# Altium footprint library SAMTEC THD.PcbLib: 161 footprints (part 2 of 12) (continued)
## SAMTEC_IPS1-105-01-L-D [mm] "10 Contacts - Pitch 2.54mm - Shrouded Power Connector Set"
height 8.51
pads (10):
  round 1.7 hole 1: 1(5.08,-1.27) 2(5.08,1.27) 3(2.54,-1.27) 4(2.54,1.27) 5(0,-1.27) 6(0,1.27) 7(-2.54,-1.27) 8(-2.54,1.27) 9(-5.08,-1.27) 10(-5.08,1.27)
Top Overlay:
  circle w0.3: c7.239,-1.27 r0.15
  lines w0.2: -6.54,-2.48 6.54,-2.48 6.54,2.48 -6.54,2.48 -6.54,-2.48
  text "2" at 6.912,0.911 h1
Mechanical 8:
  lines w0.1: -5.58,-1.27 -5.08,-1.27 ; -5.58,1.27 -5.08,1.27 ; -5.08,-1.77 -5.08,-1.27 ; -5.08,-0.77 -5.08,-1.27 ; -5.08,0.77 -5.08,1.27 ; -5.08,1.77 -5.08,1.27 ; -4.58,-1.27 -5.08,-1.27 ; -4.58,1.27 -5.08,1.27 ; -3.04,-1.27 -2.54,-1.27 ; -3.04,1.27 -2.54,1.27 ; -2.54,-1.77 -2.54,-1.27 ; -2.54,-0.77 -2.54,-1.27 ; -2.54,0.77 -2.54,1.27 ; -2.54,1.77 -2.54,1.27 ; -2.04,-1.27 -2.54,-1.27 ; -2.04,1.27 -2.54,1.27 ; -0.5,-1.27 0,-1.27 ; -0.5,0 0,0 ; -0.5,1.27 0,1.27 ; 0,-1.77 0,-1.27 ; 0,-0.77 0,-1.27 ; 0,-0.5 0,0 ; 0,0.5 0,0 ; 0,0.77 0,1.27 ; 0,1.77 0,1.27 ; 0.5,-1.27 0,-1.27 ; 0.5,0 0,0 ; 0.5,1.27 0,1.27 ; 2.04,-1.27 2.54,-1.27 ; 2.04,1.27 2.54,1.27 ; 2.54,-1.77 2.54,-1.27 ; 2.54,-0.77 2.54,-1.27 ; 2.54,0.77 2.54,1.27 ; 2.54,1.77 2.54,1.27 ; 3.04,-1.27 2.54,-1.27 ; 3.04,1.27 2.54,1.27 ; 4.58,-1.27 5.08,-1.27 ; 4.58,1.27 5.08,1.27 ; 5.08,-1.77 5.08,-1.27 ; 5.08,-0.77 5.08,-1.27 ; 5.08,0.77 5.08,1.27 ; 5.08,1.77 5.08,1.27 ; 5.58,-1.27 5.08,-1.27 ; 5.58,1.27 5.08,1.27
Mechanical 14:
  circle w0.3: c7.239,-1.27 r0.15
  lines w0.1: -6.1,-1.71 -6.1,-0.44 ; -6.091,-1.71 ccw(c-5.71,-1.71) -5.71,-2.091 ; -6.04,-1.71 -6.04,-0.5 ; -6.031,-1.71 ccw(c-5.71,-1.71) -5.71,-2.031 ; -5.71,-2.1 -4.44,-2.1 ; -5.71,-2.04 -4.44,-2.04 ; -4.44,-2.091 ccw(c-4.44,-1.71) -4.059,-1.71 ; -4.44,-2.031 ccw(c-4.44,-1.71) -4.119,-1.71 ; -4.12,-1.71 -4.12,-0.5 ; -4.06,-1.71 -4.06,-0.44 ; -3.561,-1.71 ccw(c-3.18,-1.71) -3.18,-2.091 ; -3.56,-1.71 -3.56,-0.44 ; -3.501,-1.71 ccw(c-3.18,-1.71) -3.18,-2.031 ; -3.5,-1.71 -3.5,-0.5 ; -3.18,-2.1 -1.91,-2.1 ; -3.18,-2.04 -1.91,-2.04 ; -1.9,-2.091 ccw(c-1.9,-1.71) -1.519,-1.71 ; -1.9,-2.031 ccw(c-1.9,-1.71) -1.579,-1.71 ; -1.58,-1.71 -1.58,-0.5 ; -1.52,-1.71 -1.52,-0.44 ; -1.02,-1.71 -1.02,-0.44 ; -1.011,-1.71 ccw(c-0.63,-1.71) -0.63,-2.091 ; -0.96,-1.71 -0.96,-0.5 ; -0.951,-1.71 ccw(c-0.63,-1.71) -0.63,-2.031 ; -0.63,-2.1 0.64,-2.1 ; -0.63,-2.04 0.64,-2.04 ; 0.63,-2.091 ccw(c0.63,-1.71) 1.011,-1.71 ; 0.63,-2.031 ccw(c0.63,-1.71) 0.951,-1.71 ; 0.96,-1.71 0.96,-0.5 ; 1.02,-1.71 1.02,-0.44 ; 1.519,-1.71 ccw(c1.9,-1.71) 1.9,-2.091 ; 1.52,-1.71 1.52,-0.44 ; 1.579,-1.71 ccw(c1.9,-1.71) 1.9,-2.031 ; 1.58,-1.71 1.58,-0.5 ; 1.9,-2.1 3.17,-2.1 ; 1.9,-2.04 3.17,-2.04 ; 3.18,-2.091 ccw(c3.18,-1.71) 3.561,-1.71 ; 3.18,-2.031 ccw(c3.18,-1.71) 3.501,-1.71 ; 3.5,-1.71 3.5,-0.5 ; 3.56,-1.71 3.56,-0.44 ; 4.059,-1.71 ccw(c4.44,-1.71) 4.44,-2.091 ; 4.06,-1.71 4.06,-0.44 ; 4.119,-1.71 ccw(c4.44,-1.71) 4.44,-2.031 ; 4.12,-1.71 4.12,-0.5 ; 4.44,-2.1 5.71,-2.1 ; 4.44,-2.04 5.71,-2.04 ; 5.71,-2.091 ccw(c5.71,-1.71) 6.091,-1.71 ; 5.71,-2.031 ccw(c5.71,-1.71) 6.031,-1.71 ; 6.04,-1.71 6.04,-0.5 ; 6.1,-1.71 6.1,-0.44 ; -6.1,-0.44 -4.06,-0.44 ; -6.1,-0.44 -6.04,-0.5 ; -6.1,0.44 -4.06,0.44 ; -6.1,0.44 -6.1,2.1 ; -6.1,0.44 -6.04,0.5 ; -6.1,2.1 -4.06,2.1 ; -6.1,2.1 -6.04,2.04 ; -6.04,-0.5 -4.12,-0.5 ; -6.04,0.5 -6.04,2.04 ; -6.04,0.5 -4.12,0.5 ; -6.04,2.04 -4.12,2.04 ; -4.12,-0.5 -4.06,-0.44 ; -4.12,0.5 -4.12,2.04 ; -4.12,0.5 -4.06,0.44 ; -4.12,2.04 -4.06,2.1 ; -4.06,0.44 -4.06,2.1 ; -3.56,-0.44 -1.52,-0.44 ; -3.56,-0.44 -3.5,-0.5 ; -3.56,0.44 -1.52,0.44 ; -3.56,0.44 -3.56,2.1 ; -3.56,0.44 -3.5,0.5 ; -3.56,2.1 -1.52,2.1 ; -3.56,2.1 -3.5,2.04 ; -3.5,-0.5 -1.58,-0.5 ; -3.5,0.5 -3.5,2.04 ; -3.5,0.5 -1.58,0.5 ; -3.5,2.04 -1.58,2.04 ; -1.58,-0.5 -1.52,-0.44 ; -1.58,0.5 -1.58,2.04 ; -1.58,0.5 -1.52,0.44 ; -1.58,2.04 -1.52,2.1 ; -1.52,0.44 -1.52,2.1 ; -1.02,-0.44 1.02,-0.44 ; -1.02,-0.44 -0.96,-0.5 ; -1.02,0.44 1.02,0.44 ; -1.02,0.44 -1.02,2.1 ; -1.02,0.44 -0.96,0.5 ; -1.02,2.1 1.02,2.1 ; -1.02,2.1 -0.96,2.04 ; -0.96,-0.5 0.96,-0.5 ; -0.96,0.5 -0.96,2.04 ; -0.96,0.5 0.96,0.5 ; -0.96,2.04 0.96,2.04 ; 0.96,-0.5 1.02,-0.44 ; 0.96,0.5 0.96,2.04 ; 0.96,0.5 1.02,0.44 ; 0.96,2.04 1.02,2.1 ; 1.02,0.44 1.02,2.1 ; 1.52,-0.44 3.56,-0.44 ; 1.52,-0.44 1.58,-0.5 ; 1.52,0.44 3.56,0.44 ; 1.52,0.44 1.52,2.1 ; 1.52,0.44 1.58,0.5 ; 1.52,2.1 3.56,2.1 ; 1.52,2.1 1.58,2.04 ; 1.58,-0.5 3.5,-0.5 ; 1.58,0.5 1.58,2.04 ; 1.58,0.5 3.5,0.5 ; 1.58,2.04 3.5,2.04 ; 3.5,-0.5 3.56,-0.44 ; 3.5,0.5 3.5,2.04 ; 3.5,0.5 3.56,0.44 ; 3.5,2.04 3.56,2.1 ; 3.56,0.44 3.56,2.1 ; 4.06,-0.44 6.1,-0.44 ; 4.06,-0.44 4.12,-0.5 ; 4.06,0.44 6.1,0.44 ; 4.06,0.44 4.06,2.1 ; 4.06,0.44 4.12,0.5 ; 4.06,2.1 6.1,2.1 ; 4.06,2.1 4.12,2.04 ; 4.12,-0.5 6.04,-0.5 ; 4.12,0.5 4.12,2.04 ; 4.12,0.5 6.04,0.5 ; 4.12,2.04 6.04,2.04 ; 6.04,-0.5 6.1,-0.44 ; 6.04,0.5 6.04,2.04 ; 6.04,0.5 6.1,0.44 ; 6.04,2.04 6.1,2.1 ; 6.1,0.44 6.1,2.1 ; -6.54,-2.48 -6.54,2.48 6.54,2.48 6.54,-2.48 -6.54,-2.48
  text "2" at 6.912,0.911 h1
3D body "SAMTEC_IPS1-105-01-L-D.stp": height 8.51, standoff -2.54, extent -6.54,-2.476 6.541,2.477

## SAMTEC_IPS1-120-01-L-D-RA [mm] "40 Contacts - Pitch 2.54mm - Shrouded Power Connector Set"
height 4.95
pads (40):
  round 1.7 hole 1: 1(-24.13,-3.645) 2(-24.13,-6.185) 3(-21.59,-3.645) 4(-21.59,-6.185) 5(-19.05,-3.645) 6(-19.05,-6.185) 7(-16.51,-3.645) 8(-16.51,-6.185) 9(-13.97,-3.645) 10(-13.97,-6.185) 11(-11.43,-3.645) 12(-11.43,-6.185) 13(-8.89,-3.645) 14(-8.89,-6.185) 15(-6.35,-3.645) 16(-6.35,-6.185) 17(-3.81,-3.645) 18(-3.81,-6.185) 19(-1.27,-3.645) 20(-1.27,-6.185) 21(1.27,-3.645) 22(1.27,-6.185) 23(3.81,-3.645) 24(3.81,-6.185) 25(6.35,-3.645) 26(6.35,-6.185) 27(8.89,-3.645) 28(8.89,-6.185) 29(11.43,-3.645) 30(11.43,-6.185) 31(13.97,-3.645) 32(13.97,-6.185) 33(16.51,-3.645) 34(16.51,-6.185) 35(19.05,-3.645) 36(19.05,-6.185) 37(21.59,-3.645) 38(21.59,-6.185) 39(24.13,-3.645) 40(24.13,-6.185)
Top Overlay:
  drawing of 168 lines, arcs and shapes, not listed
  text "40" at 25.781,-6.604 h1
  text "2" at -26.543,-6.604 h1
Mechanical 8:
  drawing of 205 lines, arcs and shapes, not listed
Mechanical 14:
  drawing of 188 lines, arcs and shapes, not listed
  text "40" at 25.781,-6.604 h1
  text "2" at -26.543,-6.604 h1
3D body "SAMTEC_IPS1-120-01-L-D-RA.stp": height 4.95, standoff -2.54, extent -25.59,-6.388 25.591,6.388

## SAMTEC_IPT1-105-07-L-D [mm] "10 Contacts - Pitch 2.54mm - Shrouded Power Connector Set"
height 20.3
pads (10):
  round 1.7 hole 1: 1(-5.08,-1.27) 2(-5.08,1.27) 3(-2.54,-1.27) 4(-2.54,1.27) 5(0,-1.27) 6(0,1.27) 7(2.54,-1.27) 8(2.54,1.27) 9(5.08,-1.27) 10(5.08,1.27)
Top Overlay:
  circle w0.3: c-7.325,-1.25 r0.15
  lines w0.2: -6.6,-2.54 6.599,-2.54 6.599,2.54 -6.6,2.54 -6.6,-2.54
  text "2" at -7.693,0.911 h1
Mechanical 8:
  lines w0.1: -5.58,-1.27 -5.08,-1.27 ; -5.58,1.27 -5.08,1.27 ; -5.08,-1.77 -5.08,-1.27 ; -5.08,-0.77 -5.08,-1.27 ; -5.08,0.77 -5.08,1.27 ; -5.08,1.77 -5.08,1.27 ; -4.58,-1.27 -5.08,-1.27 ; -4.58,1.27 -5.08,1.27 ; -3.04,-1.27 -2.54,-1.27 ; -3.04,1.27 -2.54,1.27 ; -2.54,-1.77 -2.54,-1.27 ; -2.54,-0.77 -2.54,-1.27 ; -2.54,0.77 -2.54,1.27 ; -2.54,1.77 -2.54,1.27 ; -2.04,-1.27 -2.54,-1.27 ; -2.04,1.27 -2.54,1.27 ; -0.5,-1.27 0,-1.27 ; -0.5,0 0,0 ; -0.5,1.27 0,1.27 ; 0,-1.77 0,-1.27 ; 0,-0.77 0,-1.27 ; 0,-0.5 0,0 ; 0,0.5 0,0 ; 0,0.77 0,1.27 ; 0,1.77 0,1.27 ; 0.5,-1.27 0,-1.27 ; 0.5,0 0,0 ; 0.5,1.27 0,1.27 ; 2.04,-1.27 2.54,-1.27 ; 2.04,1.27 2.54,1.27 ; 2.54,-1.77 2.54,-1.27 ; 2.54,-0.77 2.54,-1.27 ; 2.54,0.77 2.54,1.27 ; 2.54,1.77 2.54,1.27 ; 3.04,-1.27 2.54,-1.27 ; 3.04,1.27 2.54,1.27 ; 4.58,-1.27 5.08,-1.27 ; 4.58,1.27 5.08,1.27 ; 5.08,-1.77 5.08,-1.27 ; 5.08,-0.77 5.08,-1.27 ; 5.08,0.77 5.08,1.27 ; 5.08,1.77 5.08,1.27 ; 5.58,-1.27 5.08,-1.27 ; 5.58,1.27 5.08,1.27
Mechanical 14:
  drawing of 175 lines, arcs and shapes, not listed
  text "2" at -7.693,0.911 h1
3D body "SAMTEC_IPT1-105-07-L-D.stp": height 20.29, standoff -2.31, extent -6.604,-2.54 6.604,2.54

## SAMTEC_IPT1-125-01-S-D-RA-PL [mm] "49 Contacts, Pitch 2.54mm, Dual Row Through Mount Right Angle Header"
height 5.08
pads (49):
  round 1.7 hole 1: 2(30.48,-1.27) 3(27.94,1.27) 4(27.94,-1.27) 5(25.4,1.27) 6(25.4,-1.27) 7(22.86,1.27) 8(22.86,-1.27) 9(20.32,1.27) 10(20.32,-1.27) 11(17.78,1.27) 12(17.78,-1.27) 13(15.24,1.27) 14(15.24,-1.27) 15(12.7,1.27) 16(12.7,-1.27) 17(10.16,1.27) 18(10.16,-1.27) 19(7.62,1.27) 20(7.62,-1.27) 21(5.08,1.27) 22(5.08,-1.27) 23(2.54,1.27) 24(2.54,-1.27) 25(0,1.27) 26(0,-1.27) 27(-2.54,1.27) 28(-2.54,-1.27) 29(-5.08,1.27) 30(-5.08,-1.27) 31(-7.62,1.27) 32(-7.62,-1.27) 33(-10.16,1.27) 34(-10.16,-1.27) 35(-12.7,1.27) 36(-12.7,-1.27) 37(-15.24,1.27) 38(-15.24,-1.27) 39(-17.78,1.27) 40(-17.78,-1.27) 41(-20.32,1.27) 42(-20.32,-1.27) 43(-22.86,1.27) 44(-22.86,-1.27) 45(-25.4,1.27) 46(-25.4,-1.27) 47(-27.94,1.27) 48(-27.94,-1.27) 49(-30.48,1.27) 50(-30.48,-1.27)
Top Overlay:
  lines w0.2: -30.797,-0.113 -30.797,0.113 ; -30.797,2.427 -30.797,3.302 ; -30.162,-0.113 -30.162,0.113 ; -30.162,2.427 -30.162,3.302 ; -28.258,-0.113 -28.258,0.113 ; -28.258,2.427 -28.258,3.302 ; -27.622,-0.113 -27.622,0.113 ; -27.622,2.427 -27.622,3.302 ; 27.622,-0.113 27.622,0.113 ; 27.622,2.427 27.622,3.302 ; 28.258,-0.113 28.258,0.113 ; 28.258,2.427 28.258,3.302 ; 30.162,-0.113 30.162,3.302 ; 30.797,-0.113 30.797,3.302 ; -32.004,2.794 -32.004,9.144 32.004,9.144 32.004,2.794 31.432,2.794 31.432,3.302 29.528,3.302 29.527,2.794 28.892,2.794 28.892,3.302 26.987,3.302 26.987,2.794 26.352,2.794 26.352,3.302 24.447,3.302 24.447,2.794 23.813,2.794 23.812,3.302 21.907,3.302 21.907,2.794 21.273,2.794 21.273,3.302 19.367,3.302 19.367,2.794 18.732,2.794 18.732,3.302 16.828,3.302 16.828,2.794 16.192,2.794 16.192,3.302 14.287,3.302 14.287,2.794 13.652,2.794 13.652,3.302 11.747,3.302 11.747,2.794 11.112,2.794 11.112,3.302 9.207,3.302 9.208,2.794 8.572,2.794 8.573,3.302 6.667,3.302 6.667,2.794 6.032,2.794 6.032,3.302 4.127,3.302 4.127,2.794 3.492,2.794 3.492,3.302 1.587,3.302 1.587,2.794 0.953,2.794 0.953,3.302 -0.953,3.302 -0.953,2.794 -1.587,2.794 -1.587,3.302 -3.492,3.302 -3.492,2.794 -4.127,2.794 -4.127,3.302 -6.032,3.302 -6.032,2.794 -6.667,2.794 -6.667,3.302 -8.572,3.302 -8.572,2.794 -9.208,2.794 -9.207,3.302 -11.112,3.302 -11.112,2.794 -11.747,2.794 -11.748,3.302 -13.652,3.302 -13.652,2.794 -14.287,2.794 -14.287,3.302 -16.192,3.302 -16.192,2.794 -16.828,2.794 -16.828,3.302 -18.732,3.302 -18.732,2.794 -19.367,2.794 -19.367,3.302 -21.273,3.302 -21.273,2.794 -21.907,2.794 -21.907,3.302 -23.812,3.302 -23.813,2.794 -24.447,2.794 -24.447,3.302 -26.353,3.302 -26.352,2.794 -26.987,2.794 -26.987,3.302 -28.892,3.302 -28.892,2.794 -29.527,2.794 -29.527,3.302 -31.432,3.302 -31.432,2.794 -32.004,2.794
  text "2" at 30.052,-4 h1.2
  text "50" at -31.479,-4 h1.2
Mechanical 8:
  drawing of 200 lines, arcs and shapes, not listed
Mechanical 14:
  lines w0.1: -30.798,3.302 -30.798,-1.588 -30.163,-1.588 -30.163,3.302 ; -28.258,3.302 -28.258,-1.588 -27.623,-1.588 -27.623,3.302 ; 27.622,3.302 27.622,-1.588 28.257,-1.588 28.257,3.302 ; 30.162,3.302 30.162,-1.588 30.797,-1.588 30.797,3.302 ; -32.004,2.794 -31.433,2.794 -31.433,3.302 -29.528,3.302 -29.528,2.794 -28.893,2.794 -28.893,3.302 -26.988,3.302 -26.988,2.794 -26.353,2.794 -26.353,3.302 -24.448,3.302 -24.448,2.794 -23.813,2.794 -23.813,3.302 -21.908,3.302 -21.908,2.794 -21.273,2.794 -21.273,3.302 -19.368,3.302 -19.368,2.794 -18.733,2.794 -18.733,3.302 -16.828,3.302 -16.828,2.794 -16.193,2.794 -16.193,3.302 -14.288,3.302 -14.288,2.794 -13.653,2.794 -13.653,3.302 -11.748,3.302 -11.748,2.794 -11.113,2.794 -11.113,3.302 -9.208,3.302 -9.208,2.794 -8.573,2.794 -8.573,3.302 -6.668,3.302 -6.668,2.794 -6.033,2.794 -6.033,3.302 -4.128,3.302 -4.128,2.794 -3.493,2.794 -3.493,3.302 -1.588,3.302 -1.588,2.794 -0.953,2.794 -0.953,3.302 0.952,3.302 0.952,2.794 1.587,2.794 1.587,3.302 3.492,3.302 3.492,2.794 4.127,2.794 4.127,3.302 6.032,3.302 6.032,2.794 6.667,2.794 6.667,3.302 8.572,3.302 8.572,2.794 9.207,2.794 9.207,3.302 11.112,3.302 11.112,2.794 11.747,2.794 11.747,3.302 13.652,3.302 13.652,2.794 14.287,2.794 14.287,3.302 16.192,3.302 16.192,2.794 16.827,2.794 16.827,3.302 18.732,3.302 18.732,2.794 19.367,2.794 19.367,3.302 21.272,3.302 21.272,2.794 21.907,2.794 21.907,3.302 23.812,3.302 23.812,2.794 24.447,2.794 24.447,3.302 26.352,3.302 26.352,2.794 26.987,2.794 26.987,3.302 28.892,3.302 28.892,2.794 29.527,2.794 29.527,3.302 31.432,3.302 31.432,2.794 32.004,2.794 32.004,9.144 -32.004,9.144 -32.004,2.794
  text "2" at 30.052,-4 h1.2
  text "50" at -31.479,-4 h1.2
3D body "SAMTEC_IPT1-125-01-S-D-RA-PL.stp": height 5.08, standoff -2.29, extent -32.004,-1.588 32.004,9.144

## SAMTEC_LTMM-105-02-L-D-RA [mm] "10 Contacts - Pitch 2mm - Dual Row Through Mount Right Angle Header"
height 4.8
pads (10):
  round 1.5 hole 0.8: 1(-4,-1) 2(-4,1) 3(-2,-1) 4(-2,1) 5(0,-1) 6(0,1) 7(2,-1) 8(2,1) 9(4,-1) 10(4,1)
Top Overlay:
  circle w0.3: c-5.5,-1 r0.15
  lines w0.2: -5.302,2.905 5.302,2.905 ; -4.635,7.35 -4,5.817 -3.365,7.35 ; -4.254,2.2 -4.254,2.905 ; -3.746,2.2 -3.746,2.905 ; -2.254,2.2 -2.254,2.905 ; -1.778,7.35 -1.778,4.175 1.778,4.175 1.778,7.35 ; -1.746,2.2 -1.746,2.905 ; -0.254,2.2 -0.254,2.905 ; -0.254,4.175 -0.254,7.071 ; 0.254,2.2 0.254,2.905 ; 0.254,4.175 0.254,7.071 ; 1.746,2.2 1.746,2.905 ; 2.254,2.2 2.254,2.905 ; 3.746,2.2 3.746,2.905 ; 4.254,2.2 4.254,2.905 ; -0.254,7.071 -0.102,7.223 0.102,7.223 0.254,7.071 ; -0.254,7.071 0.254,7.071 ; -6.191,2.524 -6.191,7.35 6.191,7.35 6.191,2.524 5.302,2.524 5.302,3.921 -5.302,3.921 -5.302,2.524 -6.191,2.524
Mechanical 8:
  lines w0.1: -4.5,-1 -4,-1 ; -4.5,1 -4,1 ; -4,-1.5 -4,-1 ; -4,-0.5 -4,-1 ; -4,0.5 -4,1 ; -4,1.5 -4,1 ; -3.5,-1 -4,-1 ; -3.5,1 -4,1 ; -2.5,-1 -2,-1 ; -2.5,1 -2,1 ; -2,-1.5 -2,-1 ; -2,-0.5 -2,-1 ; -2,0.5 -2,1 ; -2,1.5 -2,1 ; -1.5,-1 -2,-1 ; -1.5,1 -2,1 ; -0.5,-1 0,-1 ; -0.5,1 0,1 ; -0.354,-0.354 0,0 ; -0.354,0.354 0,0 ; 0,-1.5 0,-1 ; 0,-0.5 0,-1 ; 0,0.5 0,1 ; 0,1.5 0,1 ; 0.354,-0.354 0,0 ; 0.354,0.354 0,0 ; 0.5,-1 0,-1 ; 0.5,1 0,1 ; 1.5,-1 2,-1 ; 1.5,1 2,1 ; 2,-1.5 2,-1 ; 2,-0.5 2,-1 ; 2,0.5 2,1 ; 2,1.5 2,1 ; 2.5,-1 2,-1 ; 2.5,1 2,1 ; 3.5,-1 4,-1 ; 3.5,1 4,1 ; 4,-1.5 4,-1 ; 4,-0.5 4,-1 ; 4,0.5 4,1 ; 4,1.5 4,1 ; 4.5,-1 4,-1 ; 4.5,1 4,1
Mechanical 14:
  circle w0.3: c-5.5,-1 r0.15
  lines w0.1: -5.302,2.905 5.302,2.905 ; -4.635,7.35 -4,5.817 -3.365,7.35 ; -4.254,2.905 -4.254,-1.254 -3.746,-1.254 -3.746,2.905 ; -2.254,2.905 -2.254,-1.254 -1.746,-1.254 -1.746,2.905 ; -1.778,7.35 -1.778,4.175 1.778,4.175 1.778,7.35 ; -0.254,2.905 -0.254,-1.254 0.254,-1.254 0.254,2.905 ; -0.254,4.175 -0.254,7.071 ; 0.254,4.175 0.254,7.071 ; 1.746,2.905 1.746,-1.254 2.254,-1.254 2.254,2.905 ; 3.746,2.905 3.746,-1.254 4.254,-1.254 4.254,2.905 ; -0.254,7.071 -0.102,7.223 0.102,7.223 0.254,7.071 ; -0.254,7.071 0.254,7.071 ; -6.191,2.524 -6.191,7.35 6.191,7.35 6.191,2.524 5.302,2.524 5.302,3.921 -5.302,3.921 -5.302,2.524 -6.191,2.524
3D body "SAMTEC_LTMM-105-02-L-D-RA.stp": height 6.54, standoff -2.13, extent -6.191,-1.254 6.191,7.35

## SAMTEC_MMCX-J-P-H-RA-TH1 [mm] "Right Angled Through-hole 50 Ohm Micro Mini RF Jack, MMCX Series"
height 3.8
pads (5):
  round 1.55 hole 0.85: 1(0,0) 2(-1.27,-1.27) 2(-1.27,1.27) 2(1.27,-1.27) 2(1.27,1.27)
Top Overlay:
  lines w0.2: -1.75,-2.287 -1.75,-4.65 ; -1.75,-0.253 -1.75,0.253 ; -0.252,-1.75 0.253,-1.75 ; -0.252,1.75 0.253,1.75 ; 1.75,-2.287 1.75,-4.65 ; 1.75,-0.253 1.75,0.253 ; -1.75,-4.65 -1.65,-4.75 1.65,-4.75 1.75,-4.65 ; -1.75,-4.65 1.75,-4.65
Mechanical 8:
  lines w0.05: -1.77,-1.27 -1.27,-1.27 ; -1.77,1.27 -1.27,1.27 ; -1.27,-1.77 -1.27,-1.27 ; -1.27,-0.77 -1.27,-1.27 ; -1.27,0.77 -1.27,1.27 ; -1.27,1.77 -1.27,1.27 ; -0.77,-1.27 -1.27,-1.27 ; -0.77,1.27 -1.27,1.27 ; -0.5,0 0,0 ; 0,-0.5 0,0 ; 0,0.5 0,0 ; 0.5,0 0,0 ; 0.77,-1.27 1.27,-1.27 ; 0.77,1.27 1.27,1.27 ; 1.27,-1.77 1.27,-1.27 ; 1.27,-0.77 1.27,-1.27 ; 1.27,0.77 1.27,1.27 ; 1.27,1.77 1.27,1.27 ; 1.77,-1.27 1.27,-1.27 ; 1.77,1.27 1.27,1.27
Mechanical 14:
  lines w0.1: -1.75,-1.75 1.75,-1.75 ; -1.75,-4.65 -1.65,-4.75 1.65,-4.75 1.75,-4.65 ; -1.75,-4.65 -1.75,1.75 1.75,1.75 1.75,-4.65 ; -1.75,-4.65 1.75,-4.65
3D body "SAMTEC_MMCX-J-P-H-RA-TH1.stp": height 3.8, standoff -3, extent -1.75,-4.75 1.75,1.75

## SAMTEC_MMCX-J-P-H-ST-TH1 [mm] "Straight Through-hole 50 Ohm Micro Mini RF Jack, MMCX Serie"
height 4.35
pads (5):
  round 1.55 hole 0.85: 1(0,0) 2(-1.27,-1.27) 2(-1.27,1.27) 2(1.27,-1.27) 2(1.27,1.27)
Top Overlay:
  lines w0.2: -1.75,-0.308 -1.75,0.308 ; -0.308,-1.75 0.308,-1.75 ; -0.308,1.75 0.308,1.75 ; 1.75,-0.308 1.75,0.308
Mechanical 8:
  lines w0.1: -1.77,-1.27 -1.27,-1.27 ; -1.77,1.27 -1.27,1.27 ; -1.27,-1.77 -1.27,-1.27 ; -1.27,-0.77 -1.27,-1.27 ; -1.27,0.77 -1.27,1.27 ; -1.27,1.77 -1.27,1.27 ; -0.77,-1.27 -1.27,-1.27 ; -0.77,1.27 -1.27,1.27 ; -0.5,0 0,0 ; 0,-0.5 0,0 ; 0,0.5 0,0 ; 0.5,0 0,0 ; 0.77,-1.27 1.27,-1.27 ; 0.77,1.27 1.27,1.27 ; 1.27,-1.77 1.27,-1.27 ; 1.27,-0.77 1.27,-1.27 ; 1.27,0.77 1.27,1.27 ; 1.27,1.77 1.27,1.27 ; 1.77,-1.27 1.27,-1.27 ; 1.77,1.27 1.27,1.27
Mechanical 14:
  circle w0.1: c0,0 r1.549
  circle w0.1: c0,0 r1.75
  circle w0.1: c0.002,0 r0.251
  circle w0.1: c0,0 r0.825
  circle w0.1: c0,0 r1.205
  lines w0.1: -1.75,-1.414 ccw(c0,0) -1.414,-1.75 1.414,-1.75 ccw(c0,0) 1.75,-1.414 1.75,1.414 ccw(c0,0) 1.414,1.75 -1.414,1.75 ccw(c0,0) -1.75,1.414 -1.75,-1.414
3D body "SAMTEC_MMCX-J-P-H-ST-TH1.stp": height 4.35, standoff -3.05, extent -1.75,-1.75 1.75,1.75

## SAMTEC_MMCX-P-P-H-ST-TH1 [mm] "Straight Through-hole 50 Ohm Micro Mini RF Plug, MMCX Serie"
height 4.35
pads (5):
  round 1.55 hole 0.85: 1(0,0) 2(-1.27,-1.27) 2(-1.27,1.27) 2(1.27,-1.27) 2(1.27,1.27)
Top Overlay:
  lines w0.2: -1.75,-0.308 -1.75,0.308 ; -0.308,-1.75 0.308,-1.75 ; -0.308,1.75 0.308,1.75 ; 1.75,-0.308 1.75,0.308
Mechanical 8:
  circle w0.1: c0,0 r1.15
  lines w0.1: -1.77,-1.27 -1.27,-1.27 ; -1.77,1.27 -1.27,1.27 ; -1.27,-1.77 -1.27,-1.27 ; -1.27,-0.77 -1.27,-1.27 ; -1.27,0.77 -1.27,1.27 ; -1.27,1.77 -1.27,1.27 ; -0.77,-1.27 -1.27,-1.27 ; -0.77,1.27 -1.27,1.27 ; -0.5,0 0,0 ; 0,-0.5 0,0 ; 0,0.5 0,0 ; 0.5,0 0,0 ; 0.77,-1.27 1.27,-1.27 ; 0.77,1.27 1.27,1.27 ; 1.27,-1.77 1.27,-1.27 ; 1.27,-0.77 1.27,-1.27 ; 1.27,0.77 1.27,1.27 ; 1.27,1.77 1.27,1.27 ; 1.77,-1.27 1.27,-1.27 ; 1.77,1.27 1.27,1.27
Mechanical 14:
  circle w0.1: c0,0 r0.138
  circle w0.1: c0,0 r0.05
  circle w0.1: c0,0 r1.485
  circle w0.1: c0,0 r1.19
  circle w0.1: c0,0 r0.8
  lines w0.1: -1.75,-1.414 ccw(c0,0) -1.414,-1.75 1.414,-1.75 ccw(c0,0) 1.75,-1.414 1.75,1.414 ccw(c0,0) 1.414,1.75 -1.414,1.75 ccw(c0,0) -1.75,1.414 -1.75,-1.414
3D body "SAMTEC_MMCX-P-P-H-ST-TH1.stp": height 4.35, standoff -3.05, extent -1.75,-1.75 1.75,1.75

## SAMTEC_MTLW-101-07-L-S-250 [mm] "1 Contacts - Pitch 2.54mm - Single Row Through Mount Straight Header (Post Lead = 6.35mm, Tail Lead 3.05mm, Insulator 1.52mm)"
height 7.87
pads (1):
  round 1.7 hole 1: 1(0,0)
Top Overlay:
  lines w0.2: -1.27,-0.737 -1.27,0.737 -1.016,1.245 1.016,1.245 1.27,0.737 1.27,-0.737 1.016,-1.245 -1.016,-1.245 -1.27,-0.737
Mechanical 8:
  lines w0.1: -0.5,0 0,0 ; 0,-0.5 0,0 ; 0,0.5 0,0 ; 0.5,0 0,0
Mechanical 14:
  lines w0.1: -1.27,-0.737 -1.27,0.737 -1.016,1.245 1.016,1.245 1.27,0.737 1.27,-0.737 1.016,-1.245 -1.016,-1.245 -1.27,-0.737 ; -0.318,-0.318 -0.318,0.318 0.318,0.318 0.318,-0.318 -0.318,-0.318
3D body "SAMTEC_MTLW-101-07-L-S-250.stp": height 7.87, standoff -3.05, extent -1.27,-1.244 1.27,1.245

## SAMTEC_MTLW-102-07-L-D-250 [mm] "4 Contacts - Pitch 2.54mm - Dual Row Through Mount Straight Header (Post Lead = 6.35mm, Tail Lead 3.05mm, Insulator 1.52mm)"
height 7.87
pads (4):
  round 1.7 hole 1: 1(-1.27,-1.27) 2(-1.27,1.27) 3(1.27,-1.27) 4(1.27,1.27)
Top Overlay:
  circle w0.3: c-1.235,-3.135 r0.15
  lines w0.2: 2.54,-2.007 2.54,2.007 ; 2.54,-2.007 2.54,2.007 ; 2.54,-2.007 2.286,-2.515 0.254,-2.515 0,-2.007 -0.254,-2.515 -2.286,-2.515 -2.54,-2.007 -2.54,2.007 -2.286,2.515 -0.254,2.515 0,2.007 0.254,2.515 2.286,2.515 2.54,2.007
  text "1" at -3.517,-1.768 h1
Mechanical 8:
  lines w0.1: -1.77,-1.27 -1.27,-1.27 ; -1.77,1.27 -1.27,1.27 ; -1.27,-1.77 -1.27,-1.27 ; -1.27,-0.77 -1.27,-1.27 ; -1.27,0.77 -1.27,1.27 ; -1.27,1.77 -1.27,1.27 ; -0.77,-1.27 -1.27,-1.27 ; -0.77,1.27 -1.27,1.27 ; -0.5,0 0,0 ; 0,-0.5 0,0 ; 0,0.5 0,0 ; 0.5,0 0,0 ; 0.77,-1.27 1.27,-1.27 ; 0.77,1.27 1.27,1.27 ; 1.27,-1.77 1.27,-1.27 ; 1.27,-0.77 1.27,-1.27 ; 1.27,0.77 1.27,1.27 ; 1.27,1.77 1.27,1.27 ; 1.77,-1.27 1.27,-1.27 ; 1.77,1.27 1.27,1.27
Mechanical 14:
  circle w0.3: c-1.235,-3.135 r0.15
  lines w0.1: 2.54,-2.007 2.54,2.007 ; 2.54,-2.007 2.54,2.007 ; 2.54,-2.007 2.286,-2.515 0.254,-2.515 0,-2.007 -0.254,-2.515 -2.286,-2.515 -2.54,-2.007 -2.54,2.007 -2.286,2.515 -0.254,2.515 0,2.007 0.254,2.515 2.286,2.515 2.54,2.007 ; -1.587,-1.587 -0.953,-1.587 -0.953,-0.953 -1.587,-0.953 -1.587,-1.587 ; -1.587,0.953 -0.953,0.953 -0.953,1.587 -1.587,1.587 -1.587,0.953 ; 0.953,-1.587 1.587,-1.587 1.587,-0.953 0.953,-0.953 0.953,-1.587 ; 0.953,0.953 1.587,0.953 1.587,1.587 0.953,1.587 0.953,0.953
  text "1" at -3.517,-1.768 h1
3D body "SAMTEC_MTLW-102-07-L-D-250.stp": height 7.87, standoff -3.05, extent -2.54,-2.514 2.54,2.515

## SAMTEC_MTLW-102-07-L-S-250 [mm] "2 Contacts - Pitch 2.54mm - Single Row Through Mount Straight Header (Post Lead = 6.35mm, Tail Lead 3.05mm, Insulator 1.52mm)"
height 7.87
pads (2):
  round 1.7 hole 1: 1(0,0) 2(2.54,0)
Top Overlay:
  circle w0.3: c-0.508,1.778 r0.15
  lines w0.2: -1.27,-0.737 -1.27,0.737 -1.016,1.245 1.016,1.245 1.27,0.737 1.524,1.245 3.556,1.245 3.81,0.737 3.81,-0.737 3.556,-1.245 1.524,-1.245 1.27,-0.737 1.016,-1.245 -1.016,-1.245 -1.27,-0.737
Mechanical 8:
  lines w0.1: -0.5,0 0,0 ; 0,-0.5 0,0 ; 0,0.5 0,0 ; 0.5,0 0,0 ; 2.04,0 2.54,0 ; 2.54,-0.5 2.54,0 ; 2.54,0.5 2.54,0 ; 3.04,0 2.54,0
Mechanical 14:
  circle w0.3: c-0.508,1.778 r0.15
  lines w0.1: -1.27,-0.737 -1.016,-1.245 1.016,-1.245 1.27,-0.737 1.524,-1.245 3.556,-1.245 3.81,-0.737 3.81,0.737 3.556,1.245 1.524,1.245 1.27,0.737 1.016,1.245 -1.016,1.245 -1.27,0.737 -1.27,-0.737 ; -0.317,-0.318 0.318,-0.318 0.318,0.318 -0.317,0.318 -0.317,-0.318 ; 2.223,-0.318 2.858,-0.318 2.858,0.318 2.223,0.318 2.223,-0.318
3D body "SAMTEC_MTLW-102-07-L-S-250.stp": height 7.87, standoff -3.05, extent -1.27,-1.244 3.81,1.245